# Altium footprint library PcbLib_ICs.PcbLib: 317 footprints (part 15 of 24) (continued)
## QFN88(TICP) [mm] "QFN, 88-Leads, Body 10.00x10.00mm, Pitch 0.40mm, Thermal Pad 5.60x5.60mm, IPC Medium Density" (continued)
  region: -1.3,2 -1.3,1.5 -0.8,1.5 -0.8,2
  region: 2,0.8 2,1.3 1.5,1.3 1.5,0.8
  region: 1.3,0.8 1.3,1.3 0.8,1.3 0.8,0.8
  region: 0.8,2 0.8,1.5 1.3,1.5 1.3,2
  region: 1.5,2 1.5,1.5 2,1.5 2,2
  region: 0.6,-2 0.6,-1.5 0.1,-1.5 0.1,-2
  region: -0.1,-2 -0.1,-1.5 -0.6,-1.5 -0.6,-2
  region: -0.6,-0.8 -0.6,-1.3 -0.1,-1.3 -0.1,-0.8
  region: 0.1,-0.8 0.1,-1.3 0.6,-1.3 0.6,-0.8
  region: -0.8,-2 -0.8,-1.5 -1.3,-1.5 -1.3,-2
  region: -1.5,-2 -1.5,-1.5 -2,-1.5 -2,-2
  region: -2,-0.8 -2,-1.3 -1.5,-1.3 -1.5,-0.8
  region: -1.3,-0.8 -1.3,-1.3 -0.8,-1.3 -0.8,-0.8
  region: 2,-2 2,-1.5 1.5,-1.5 1.5,-2
  region: 1.3,-2 1.3,-1.5 0.8,-1.5 0.8,-2
  region: 0.8,-0.8 0.8,-1.3 1.3,-1.3 1.3,-0.8
  region: 1.5,-0.8 1.5,-1.3 2,-1.3 2,-0.8
  region: 2.7,-0.6 2.7,-0.1 2.2,-0.1 2.2,-0.6
  region: 2.2,0.6 2.2,0.1 2.7,0.1 2.7,0.6
  region: 2.7,0.8 2.7,1.3 2.2,1.3 2.2,0.8
  region: 2.2,2 2.2,1.5 2.7,1.5 2.7,2
  region: 2.7,-2 2.7,-1.5 2.2,-1.5 2.2,-2
  region: 2.2,-0.8 2.2,-1.3 2.7,-1.3 2.7,-0.8
  region: -2.7,0.6 -2.7,0.1 -2.2,0.1 -2.2,0.6
  region: -2.2,-0.6 -2.2,-0.1 -2.7,-0.1 -2.7,-0.6
  region: -2.7,-0.8 -2.7,-1.3 -2.2,-1.3 -2.2,-0.8
  region: -2.2,-2 -2.2,-1.5 -2.7,-1.5 -2.7,-2
  region: -2.7,2 -2.7,1.5 -2.2,1.5 -2.2,2
  region: -2.2,0.8 -2.2,1.3 -2.7,1.3 -2.7,0.8
  region: -0.6,2.7 -0.6,2.2 -0.1,2.2 -0.1,2.7
  region: 0.1,2.7 0.1,2.2 0.6,2.2 0.6,2.7
  region: -2,2.7 -2,2.2 -1.5,2.2 -1.5,2.7
  region: -1.3,2.7 -1.3,2.2 -0.8,2.2 -0.8,2.7
  region: 0.8,2.7 0.8,2.2 1.3,2.2 1.3,2.7
  region: 1.5,2.7 1.5,2.2 2,2.2 2,2.7
  region: 2.2,2.7 2.2,2.2 2.7,2.2 2.7,2.7
  region: -2.7,2.7 -2.7,2.2 -2.2,2.2 -2.2,2.7
  region: 0.6,-2.7 0.6,-2.2 0.1,-2.2 0.1,-2.7
  region: -0.1,-2.7 -0.1,-2.2 -0.6,-2.2 -0.6,-2.7
  region: 2,-2.7 2,-2.2 1.5,-2.2 1.5,-2.7
  region: 1.3,-2.7 1.3,-2.2 0.8,-2.2 0.8,-2.7
  region: -0.8,-2.7 -0.8,-2.2 -1.3,-2.2 -1.3,-2.7
  region: -1.5,-2.7 -1.5,-2.2 -2,-2.2 -2,-2.7
  region: -2.2,-2.7 -2.2,-2.2 -2.7,-2.2 -2.7,-2.7
  region: 2.7,-2.7 2.7,-2.2 2.2,-2.2 2.2,-2.7
Bottom Solder:
  region: -3,3 -0.6,3 0,2.4 0.6,3 3,3 3,0.6 2.4,0 3,-0.601 3,-3 0.6,-3 0,-2.4 -0.6,-3 -3,-3 -3,-0.6 -2.4,0 -3,0.6
Top Assy:
  drawing of 798 lines, arcs and shapes, not listed
  text ".Designator" at -3.443,0.933 h2
Top Text:
  lines w0.05: -5.575,-5.575 5.575,-5.575 5.575,5.575 -5.575,5.575 -5.575,-5.575
  lines w0.1: -0.5,0 0.5,0 ; 0,-0.5 0,0.5
3D body "MDR32F02FI_QFN88_TICP.x_t": height 0.75, standoff 0, extent -5.02,-5.02 5.02,5.02

## QFN-36_USB2514 [mm] "QFN-36 with 0.5mm pitch"
height 1
pads (37):
  rect 0.8x0.28 smd paste+0 mask+0.05: 1(-2.9,2)
  oval 0.8x0.28 smd paste+0 mask+0.05: 2(-2.9,1.5) 3(-2.9,1) 4(-2.9,0.5) 5(-2.9,0) 6(-2.9,-0.5) 7(-2.9,-1) 8(-2.9,-1.5) 9(-2.9,-2) 19(2.9,-2) 20(2.9,-1.5) 21(2.9,-1) 22(2.9,-0.5) 23(2.9,0) 24(2.9,0.5) 25(2.9,1) 26(2.9,1.5) 27(2.9,2)
  oval 0.28x0.8 smd paste+0 mask+0.05: 10(-2,-2.9) 11(-1.5,-2.9) 12(-1,-2.9) 13(-0.5,-2.9) 14(0,-2.9) 15(0.5,-2.9) 16(1,-2.9) 17(1.5,-2.9) 18(2,-2.9) 28(2,2.9) 29(1.5,2.9) 30(1,2.9) 31(0.5,2.9) 32(0,2.9) 33(-0.5,2.9) 34(-1,2.9) 35(-1.5,2.9) 36(-2,2.9)
  rrect7% 3.7x3.7 smd paste-10 mask+0.05: EP(0,0)
via 1.25,0 diameter 0.7 hole 0.3
via 0,0 diameter 0.7 hole 0.3
via 0,1.25 diameter 0.7 hole 0.3
via -1.25,0 diameter 0.7 hole 0.3
via 0,-1.25 diameter 0.7 hole 0.3
Top Overlay:
  circle w0.25: c-3.75,2.95 r0.125
  lines w0.2: -3.2,-2.75 -3.2,-3.2 -2.75,-3.2 ; -3.2,2.75 -3.2,3.2 -2.75,3.2 ; 2.75,-3.2 3.2,-3.2 3.2,-2.75 ; 2.75,3.2 3.2,3.2 3.2,2.75
Top Paste:
  rectangle: 0.1,-0.7 0.7,-0.1
  rectangle: -0.7,-0.7 -0.1,-0.1
  rectangle: -1.5,-0.7 -0.9,-0.1
  rectangle: 0.9,-0.7 1.5,-0.1
  region: -0.1,0.7 -0.7,0.7 -0.7,0.1 -0.1,0.1
  region: 0.7,0.7 0.1,0.7 0.1,0.1 0.7,0.1
  region: 1.5,0.7 0.9,0.7 0.9,0.1 1.5,0.1
  region: -0.9,0.7 -1.5,0.7 -1.5,0.1 -0.9,0.1
  region: -0.1,1.5 -0.7,1.5 -0.7,0.9 -0.1,0.9
  region: 0.7,1.5 0.1,1.5 0.1,0.9 0.7,0.9
  region: 1.5,1.5 0.9,1.5 0.9,0.9 1.5,0.9
  region: -0.9,1.5 -1.5,1.5 -1.5,0.9 -0.9,0.9
  rectangle: 0.1,-1.5 0.7,-0.9
  rectangle: -0.7,-1.5 -0.1,-0.9
  rectangle: -1.5,-1.5 -0.9,-0.9
  rectangle: 0.9,-1.5 1.5,-0.9
Bottom Solder:
  region: -1.95,1.95 -0.25,1.95 0,1.7 0.25,1.95 1.95,1.95 1.95,0.25 1.7,0 1.95,-0.25 1.95,-1.95 0.25,-1.95 0,-1.7 -0.25,-1.95 -1.95,-1.95 -1.95,-0.25 -1.7,0 -1.95,0.25
Top Assy:
  drawing of 297 lines, arcs and shapes, not listed
  text ".Designator" at -3.443,-0.467 h2
Top Text:
  lines w0.05: -3.6,-3.6 3.6,-3.6 3.6,3.6 -3.6,3.6 -3.6,-3.6
  lines w0.1: -0.5,0 0.5,0 ; 0,-0.5 0,0.5
3D body "QFN-36_USB2514B.x_t": height 0.9, standoff 0, extent -3.02,-3.02 3.02,3.02

## QFN-44 [mm] "QFN, 44-Leads, Body 7,00x7,00mm, Pitch 0,50mm, Thermal Pad 5,15x5,10mm, IPC Medium Density"
height 0.75
pads (45):
  rect 0.95x0.25 smd paste+0 mask+0.075: 1(-3.375,2.5)
  oval 0.95x0.25 smd paste+0 mask+0.075: 2(-3.375,2) 3(-3.375,1.5) 4(-3.375,1) 5(-3.375,0.5) 6(-3.375,0) 7(-3.375,-0.5) 8(-3.375,-1) 9(-3.375,-1.5) 10(-3.375,-2) 11(-3.375,-2.5) 23(3.375,-2.5) 24(3.375,-2) 25(3.375,-1.5) 26(3.375,-1) 27(3.375,-0.5) 28(3.375,0) 29(3.375,0.5) 30(3.375,1) 31(3.375,1.5) 32(3.375,2) 33(3.375,2.5)
  oval 0.25x0.95 smd paste+0 mask+0.075: 12(-2.5,-3.375) 13(-2,-3.375) 14(-1.5,-3.375) 15(-1,-3.375) 16(-0.5,-3.375) 17(0,-3.375) 18(0.5,-3.375) 19(1,-3.375) 20(1.5,-3.375) 21(2,-3.375) 22(2.5,-3.375) 34(2.5,3.375) 35(2,3.375) 36(1.5,3.375) 37(1,3.375) 38(0.5,3.375) 39(0,3.375) 40(-0.5,3.375) 41(-1,3.375) 42(-1.5,3.375) 43(-2,3.375) 44(-2.5,3.375)
  rrect15% 5.15x5.15 smd paste-50 mask+0.075: EP(0,0)
via 2.2,-2.2 diameter 0.5 hole 0.2
via 1.1,-2.2 diameter 0.5 hole 0.2
via 0,-2.2 diameter 0.5 hole 0.2
via -1.1,-2.2 diameter 0.5 hole 0.2
via -2.2,-2.2 diameter 0.5 hole 0.2
via 2.2,-1.1 diameter 0.5 hole 0.2
via 1.1,-1.1 diameter 0.5 hole 0.2
via 0,-1.1 diameter 0.5 hole 0.2
via -1.1,-1.1 diameter 0.5 hole 0.2
via -2.2,-1.1 diameter 0.5 hole 0.2
via 2.2,0 diameter 0.5 hole 0.2
via 1.1,0 diameter 0.5 hole 0.2
via 0,0 diameter 0.5 hole 0.2
via -1.1,0 diameter 0.5 hole 0.2
via -2.2,0 diameter 0.5 hole 0.2
via 2.2,1.1 diameter 0.5 hole 0.2
via 1.1,1.1 diameter 0.5 hole 0.2
via 0,1.1 diameter 0.5 hole 0.2
via -1.1,1.1 diameter 0.5 hole 0.2
via -2.2,1.1 diameter 0.5 hole 0.2
via 2.2,2.2 diameter 0.5 hole 0.2
via 1.1,2.2 diameter 0.5 hole 0.2
via 0,2.2 diameter 0.5 hole 0.2
via -1.1,2.2 diameter 0.5 hole 0.2
via -2.2,2.2 diameter 0.5 hole 0.2
Top Overlay:
  circle w0.25: c-4.35,3.55 r0.125
  lines w0.2: -3.7,-3.025 -3.7,-3.7 -3.025,-3.7 ; -3.7,3.025 -3.7,3.7 -3.025,3.7 ; 3.025,-3.7 3.7,-3.7 3.7,-3.025 ; 3.025,3.7 3.7,3.7 3.7,3.025
Top Paste:
  region: 0.1,0.6 0.1,0.1 0.6,0.1 0.6,0.6
  region: -0.6,0.6 -0.6,0.1 -0.1,0.1 -0.1,0.6
  region: -1.3,0.6 -1.3,0.1 -0.8,0.1 -0.8,0.6
  region: -2,0.6 -2,0.1 -1.5,0.1 -1.5,0.6
  region: -2.65,0.6 -2.65,0.1 -2.2,0.1 -2.2,0.6
  region: 0.8,0.6 0.8,0.1 1.3,0.1 1.3,0.6
  region: 1.5,0.6 1.5,0.1 2,0.1 2,0.6
  region: 2.2,0.6 2.2,0.1 2.65,0.1 2.65,0.6
  region: 0.1,1.3 0.1,0.8 0.6,0.8 0.6,1.3
  region: -0.6,1.3 -0.6,0.8 -0.1,0.8 -0.1,1.3
  region: -1.3,1.3 -1.3,0.8 -0.8,0.8 -0.8,1.3
  region: -2,1.3 -2,0.8 -1.5,0.8 -1.5,1.3
  region: -2.65,1.3 -2.65,0.8 -2.2,0.8 -2.2,1.3
  region: 0.8,1.3 0.8,0.8 1.3,0.8 1.3,1.3
  region: 1.5,1.3 1.5,0.8 2,0.8 2,1.3
  region: 2.2,1.3 2.2,0.8 2.65,0.8 2.65,1.3
  region: 0.1,2 0.1,1.5 0.6,1.5 0.6,2
  region: -0.6,2 -0.6,1.5 -0.1,1.5 -0.1,2
  region: -1.3,2 -1.3,1.5 -0.8,1.5 -0.8,2
  region: -2,2 -2,1.5 -1.5,1.5 -1.5,2
  region: -2.65,2 -2.65,1.5 -2.2,1.5 -2.2,2
  region: 0.8,2 0.8,1.5 1.3,1.5 1.3,2
  region: 1.5,2 1.5,1.5 2,1.5 2,2
  region: 2.2,2 2.2,1.5 2.65,1.5 2.65,2
  region: -0.1,-0.6 -0.1,-0.1 -0.6,-0.1 -0.6,-0.6
  region: 0.6,-0.6 0.6,-0.1 0.1,-0.1 0.1,-0.6
  region: 1.3,-0.6 1.3,-0.1 0.8,-0.1 0.8,-0.6
  region: 2,-0.6 2,-0.1 1.5,-0.1 1.5,-0.6
  region: 2.65,-0.6 2.65,-0.1 2.2,-0.1 2.2,-0.6
  region: -0.8,-0.6 -0.8,-0.1 -1.3,-0.1 -1.3,-0.6
  region: -1.5,-0.6 -1.5,-0.1 -2,-0.1 -2,-0.6
  region: -2.2,-0.6 -2.2,-0.1 -2.65,-0.1 -2.65,-0.6
  region: -0.1,-1.3 -0.1,-0.8 -0.6,-0.8 -0.6,-1.3
  region: 0.6,-1.3 0.6,-0.8 0.1,-0.8 0.1,-1.3
  region: 1.3,-1.3 1.3,-0.8 0.8,-0.8 0.8,-1.3
  region: 2,-1.3 2,-0.8 1.5,-0.8 1.5,-1.3
  region: 2.65,-1.3 2.65,-0.8 2.2,-0.8 2.2,-1.3
  region: -0.8,-1.3 -0.8,-0.8 -1.3,-0.8 -1.3,-1.3
  region: -1.5,-1.3 -1.5,-0.8 -2,-0.8 -2,-1.3
  region: -2.2,-1.3 -2.2,-0.8 -2.65,-0.8 -2.65,-1.3
  region: -0.1,-2 -0.1,-1.5 -0.6,-1.5 -0.6,-2
  region: 0.6,-2 0.6,-1.5 0.1,-1.5 0.1,-2
  region: 1.3,-2 1.3,-1.5 0.8,-1.5 0.8,-2
  region: 2,-2 2,-1.5 1.5,-1.5 1.5,-2
  region: 2.65,-2 2.65,-1.5 2.2,-1.5 2.2,-2
  region: -0.8,-2 -0.8,-1.5 -1.3,-1.5 -1.3,-2
  region: -1.5,-2 -1.5,-1.5 -2,-1.5 -2,-2
  region: -2.2,-2 -2.2,-1.5 -2.65,-1.5 -2.65,-2
  region: -1.5,-2.2 -2,-2.2 -2,-2.65 -1.5,-2.65
  rectangle: -0.6,-2.65 -0.1,-2.2
  rectangle: -1.3,-2.65 -0.8,-2.2
  region: 0.6,-2.2 0.1,-2.2 0.1,-2.65 0.6,-2.65
  region: 1.3,-2.2 0.8,-2.2 0.8,-2.65 1.3,-2.65
  region: 2,-2.2 1.5,-2.2 1.5,-2.65 2,-2.65
  region: 1.3,2.65 0.8,2.65 0.8,2.2 1.3,2.2
  region: 2,2.65 1.5,2.65 1.5,2.2 2,2.2
  rectangle: 0.1,2.2 0.6,2.65
  rectangle: -0.6,2.2 -0.1,2.65
  rectangle: -1.3,2.2 -0.8,2.65
  region: -1.5,2.65 -2,2.65 -2,2.2 -1.5,2.2
Top Assy:
  circle w0.05: c-2.75,2.75 r0.3
  lines w0.05: -3.557,-2.6 -3.59,-2.6 -3.59,-2.4 -3.557,-2.4 ; -3.557,-2.1 -3.59,-2.1 -3.59,-1.9 -3.557,-1.9 ; -3.557,-1.6 -3.59,-1.6 -3.59,-1.4 -3.557,-1.4 ; -3.557,-1.1 -3.59,-1.1 -3.59,-0.9 -3.557,-0.9 ; -3.557,-0.6 -3.59,-0.6 -3.59,-0.4 -3.557,-0.4 ; -3.557,-0.1 -3.59,-0.1 -3.59,0.1 -3.557,0.1 ; -3.557,0.4 -3.59,0.4 -3.59,0.6 -3.557,0.6 ; -3.557,0.9 -3.59,0.9 -3.59,1.1 -3.557,1.1 ; -3.557,1.4 -3.59,1.4 -3.59,1.6 -3.557,1.6 ; -3.557,1.9 -3.59,1.9 -3.59,2.1 -3.557,2.1 ; -3.557,2.4 -3.59,2.4 -3.59,2.6 -3.557,2.6 ; -2.6,-3.557 -2.6,-3.59 -2.4,-3.59 -2.4,-3.557 ; -2.6,3.557 -2.6,3.59 -2.4,3.59 -2.4,3.557 ; -2.1,-3.557 -2.1,-3.59 -1.9,-3.59 -1.9,-3.557 ; -2.1,3.557 -2.1,3.59 -1.9,3.59 -1.9,3.557 ; -1.6,-3.557 -1.6,-3.59 -1.4,-3.59 -1.4,-3.557 ; -1.6,3.557 -1.6,3.59 -1.4,3.59 -1.4,3.557 ; -1.1,-3.557 -1.1,-3.59 -0.9,-3.59 -0.9,-3.557 ; -1.1,3.557 -1.1,3.59 -0.9,3.59 -0.9,3.557 ; -0.6,-3.557 -0.6,-3.59 -0.4,-3.59 -0.4,-3.557 ; -0.6,3.557 -0.6,3.59 -0.4,3.59 -0.4,3.557 ; -0.1,-3.557 -0.1,-3.59 0.1,-3.59 0.1,-3.557 ; -0.1,3.557 -0.1,3.59 0.1,3.59 0.1,3.557 ; 0.4,-3.557 0.4,-3.59 0.6,-3.59 0.6,-3.557 ; 0.4,3.557 0.4,3.59 0.6,3.59 0.6,3.557 ; 0.9,-3.557 0.9,-3.59 1.1,-3.59 1.1,-3.557 ; 0.9,3.557 0.9,3.59 1.1,3.59 1.1,3.557 ; 1.4,-3.557 1.4,-3.59 1.6,-3.59 1.6,-3.557 ; 1.4,3.557 1.4,3.59 1.6,3.59 1.6,3.557 ; 1.9,-3.557 1.9,-3.59 2.1,-3.59 2.1,-3.557 ; 1.9,3.557 1.9,3.59 2.1,3.59 2.1,3.557 ; 2.4,-3.557 2.4,-3.59 2.6,-3.59 2.6,-3.557 ; 2.4,3.557 2.4,3.59 2.6,3.59 2.6,3.557 ; 3.557,-2.6 3.59,-2.6 3.59,-2.4 3.557,-2.4 ; 3.557,-2.1 3.59,-2.1 3.59,-1.9 3.557,-1.9 ; 3.557,-1.6 3.59,-1.6 3.59,-1.4 3.557,-1.4 ; 3.557,-1.1 3.59,-1.1 3.59,-0.9 3.557,-0.9 ; 3.557,-0.6 3.59,-0.6 3.59,-0.4 3.557,-0.4 ; 3.557,-0.1 3.59,-0.1 3.59,0.1 3.557,0.1 ; 3.557,0.4 3.59,0.4 3.59,0.6 3.557,0.6 ; 3.557,0.9 3.59,0.9 3.59,1.1 3.557,1.1 ; 3.557,1.4 3.59,1.4 3.59,1.6 3.557,1.6 ; 3.557,1.9 3.59,1.9 3.59,2.1 3.557,2.1 ; 3.557,2.4 3.59,2.4 3.59,2.6 3.557,2.6 ; -3.55,-3.55 3.55,-3.55 3.55,3.55 -3.55,3.55 -3.55,-3.55
  text ".Designator" at -3.443,-0.467 h2
Top Text:
  lines w0.05: -4.1,-4.1 4.1,-4.1 4.1,4.1 -4.1,4.1 -4.1,-4.1
  lines w0.1: -0.5,0 0.5,0 ; 0,-0.5 0,0.5
3D body "QFN-44.step": height 0.75, standoff 0, extent -3.6,-3.6 3.6,3.6

## QFN-64_USB2517 [mm] "QFN-64 with 0.5mm pitch"
height 1
pads (65):
  rect 0.75x0.28 smd paste+0 mask+0.05: 1(-4.425,3.75)
  oval 0.75x0.28 smd paste+0 mask+0.05: 2(-4.425,3.25) 3(-4.425,2.75) 4(-4.425,2.25) 5(-4.425,1.75) 6(-4.425,1.25) 7(-4.425,0.75) 8(-4.425,0.25) 9(-4.425,-0.25) 10(-4.425,-0.75) 11(-4.425,-1.25) 12(-4.425,-1.75) 13(-4.425,-2.25) 14(-4.425,-2.75) 15(-4.425,-3.25) 16(-4.425,-3.75) 33(4.425,-3.75) 34(4.425,-3.25) 35(4.425,-2.75) 36(4.425,-2.25) 37(4.425,-1.75) 38(4.425,-1.25) 39(4.425,-0.75) 40(4.425,-0.25) 41(4.425,0.25) 42(4.425,0.75) 43(4.425,1.25) 44(4.425,1.75) 45(4.425,2.25) 46(4.425,2.75) 47(4.425,3.25) 48(4.425,3.75)
  oval 0.28x0.75 smd paste+0 mask+0.05: 17(-3.775,-4.425) 18(-3.275,-4.425) 19(-2.775,-4.425) 20(-2.275,-4.425) 21(-1.775,-4.425) 22(-1.275,-4.425) 23(-0.775,-4.425) 24(-0.275,-4.425) 25(0.225,-4.425) 26(0.725,-4.425) 27(1.225,-4.425) 28(1.725,-4.425) 29(2.225,-4.425) 30(2.725,-4.425) 31(3.225,-4.425) 32(3.725,-4.425) 49(3.75,4.425) 50(3.25,4.425) 51(2.75,4.425) 52(2.25,4.425) 53(1.75,4.425) 54(1.25,4.425) 55(0.75,4.425) 56(0.25,4.425) 57(-0.25,4.425) 58(-0.75,4.425) 59(-1.25,4.425) 60(-1.75,4.425) 61(-2.25,4.425) 62(-2.75,4.425) 63(-3.25,4.425) 64(-3.75,4.425)
  rrect10% 5x5 smd paste-10 mask+0.08: EP(0,0)
via 0,0 diameter 0.7 hole 0.3
via 2,2 diameter 0.7 hole 0.3
via 1.75,1 diameter 0.7 hole 0.3
via 1,1.75 diameter 0.7 hole 0.3
via 0.75,0.75 diameter 0.7 hole 0.3
via -0.75,0.75 diameter 0.7 hole 0.3
via -1.75,1 diameter 0.7 hole 0.3
via -1,1.75 diameter 0.7 hole 0.3
via -2,2 diameter 0.7 hole 0.3
via -0.75,-0.75 diameter 0.7 hole 0.3
via -1,-1.75 diameter 0.7 hole 0.3
via -1.75,-1 diameter 0.7 hole 0.3
via -2,-2 diameter 0.7 hole 0.3
via 0.75,-0.75 diameter 0.7 hole 0.3
via 1.75,-1 diameter 0.7 hole 0.3
via 1,-1.75 diameter 0.7 hole 0.3
via 2,-2 diameter 0.7 hole 0.3
via -1.4,0 diameter 0.7 hole 0.3
via 0,1.4 diameter 0.7 hole 0.3
via 1.4,0 diameter 0.7 hole 0.3
via 0,-1.4 diameter 0.7 hole 0.3
Top Overlay:
  circle w0.25: c-5.35,4.55 r0.125
  lines w0.2: -4.65,-4.2 -4.65,-4.65 -4.2,-4.65 ; -4.65,4.2 -4.65,4.65 -4.2,4.65 ; 4.2,-4.65 4.65,-4.65 4.65,-4.2 ; 4.2,4.65 4.65,4.65 4.65,4.2
Top Paste:
  region: -1.7,2.3 -2.3,2.3 -2.3,1.7 -1.7,1.7
  region: -1.7,1.5 -2.3,1.5 -2.3,0.9 -1.7,0.9
  rectangle: -2.3,-2.3 -1.7,-1.7
  rectangle: -2.3,-1.5 -1.7,-0.9
  rectangle: -2.3,-0.7 -1.7,-0.1
  region: -1.7,0.7 -2.3,0.7 -2.3,0.1 -1.7,0.1
  rectangle: 1.7,-2.3 2.3,-1.7
  rectangle: 1.7,-1.5 2.3,-0.9
  region: 2.3,2.3 1.7,2.3 1.7,1.7 2.3,1.7
  region: 2.3,1.5 1.7,1.5 1.7,0.9 2.3,0.9
  region: 2.3,0.7 1.7,0.7 1.7,0.1 2.3,0.1
  rectangle: 1.7,-0.7 2.3,-0.1
  rectangle: 0.9,-2.3 1.5,-1.7
  rectangle: -1.5,-2.3 -0.9,-1.7
  rectangle: -0.7,-2.3 -0.1,-1.7
  rectangle: 0.1,-2.3 0.7,-1.7
  rectangle: 0.9,-1.5 1.5,-0.9
  rectangle: -1.5,-1.5 -0.9,-0.9
  rectangle: -0.7,-1.5 -0.1,-0.9
  rectangle: 0.1,-1.5 0.7,-0.9
  region: -0.9,2.3 -1.5,2.3 -1.5,1.7 -0.9,1.7
  region: 1.5,2.3 0.9,2.3 0.9,1.7 1.5,1.7
  region: 0.7,2.3 0.1,2.3 0.1,1.7 0.7,1.7
  region: -0.1,2.3 -0.7,2.3 -0.7,1.7 -0.1,1.7
  region: -0.9,1.5 -1.5,1.5 -1.5,0.9 -0.9,0.9
  region: 1.5,1.5 0.9,1.5 0.9,0.9 1.5,0.9
  region: 0.7,1.5 0.1,1.5 0.1,0.9 0.7,0.9
  region: -0.1,1.5 -0.7,1.5 -0.7,0.9 -0.1,0.9
  region: -0.9,0.7 -1.5,0.7 -1.5,0.1 -0.9,0.1
  region: 1.5,0.7 0.9,0.7 0.9,0.1 1.5,0.1
  region: 0.7,0.7 0.1,0.7 0.1,0.1 0.7,0.1
  region: -0.1,0.7 -0.7,0.7 -0.7,0.1 -0.1,0.1
  rectangle: 0.9,-0.7 1.5,-0.1
  rectangle: -1.5,-0.7 -0.9,-0.1
  rectangle: -0.7,-0.7 -0.1,-0.1
  rectangle: 0.1,-0.7 0.7,-0.1
Bottom Solder:
  region: -3,3 -0.75,3 0,2.25 0.75,3 3,3 3,0.75 2.25,0 3,-0.75 3,-3 0.75,-3 0,-2.25 -0.75,-3 -3,-3 -3,-0.75 -2.25,0 -3,0.75
Top Assy:
  drawing of 801 lines, arcs and shapes, not listed
  text ".Designator" at -3.443,-0.467 h2
Top Text:
  lines w0.05: -4.85,-4.85 -4.85,4.85 4.85,4.85 4.85,-4.85 -4.85,-4.85
  lines w0.1: -0.5,0 0.5,0 ; 0,-0.5 0,0.5
3D body "User Library-LFCSP-64 AD9984AKCPZ-170.step": height 0.85, standoff -0.02, extent -4.5,-4.5 4.5,4.5

## QFN-72_USB5537B [mm] "QFN-72 package with 0.5mm pitch"
height 1
pads (81):
  rect 0.8x0.25 smd paste+0 mask+0.05: 1(-4.925,4.25)
  oval 0.8x0.25 smd paste+0 mask+0.05: 2(-4.925,3.75) 3(-4.925,3.25) 4(-4.925,2.75) 5(-4.925,2.25) 6(-4.925,1.75) 7(-4.925,1.25) 8(-4.925,0.75) 9(-4.925,0.25) 10(-4.925,-0.25) 11(-4.925,-0.75) 12(-4.925,-1.25) 13(-4.925,-1.75) 14(-4.925,-2.25) 15(-4.925,-2.75) 16(-4.925,-3.25) 17(-4.925,-3.75) 18(-4.925,-4.25) 37(4.925,-4.25) 38(4.925,-3.75) 39(4.925,-3.25) 40(4.925,-2.75) 41(4.925,-2.25) 42(4.925,-1.75) 43(4.925,-1.25) 44(4.925,-0.75) 45(4.925,-0.25) 46(4.925,0.25) 47(4.925,0.75) 48(4.925,1.25) 49(4.925,1.75) 50(4.925,2.25) 51(4.925,2.75) 52(4.925,3.25) 53(4.925,3.75) 54(4.925,4.25)
  oval 0.25x0.8 smd paste+0 mask+0.05: 19(-4.25,-4.925) 20(-3.75,-4.925) 21(-3.25,-4.925) 22(-2.75,-4.925) 23(-2.25,-4.925) 24(-1.75,-4.925) 25(-1.25,-4.925) 26(-0.75,-4.925) 27(-0.25,-4.925) 28(0.25,-4.925) 29(0.75,-4.925) 30(1.25,-4.925) 31(1.75,-4.925) 32(2.25,-4.925) 33(2.75,-4.925) 34(3.25,-4.925) 35(3.75,-4.925) 36(4.25,-4.925) 55(4.25,4.925) 56(3.75,4.925) 57(3.25,4.925) 58(2.75,4.925) 59(2.25,4.925) 60(1.75,4.925) 61(1.25,4.925) 62(0.75,4.925) 63(0.25,4.925) 64(-0.25,4.925) 65(-0.75,4.925) 66(-1.25,4.925) 67(-1.75,4.925) 68(-2.25,4.925) 69(-2.75,4.925) 70(-3.25,4.925) 71(-3.75,4.925) 72(-4.25,4.925)
  rrect10% 2x2 smd paste-10 mask+0.08: EP(-2.2,-2.2) EP(-2.2,0) EP(-2.2,2.2) EP(0,-2.2) EP(0,0) EP(0,2.2) EP(2.2,-2.2) EP(2.2,0) EP(2.2,2.2)
via -2.8,1.6 diameter 0.7 hole 0.3
via -1.6,1.6 diameter 0.7 hole 0.3
via -1.6,2.8 diameter 0.7 hole 0.3
via -2.8,2.8 diameter 0.7 hole 0.3
via -0.6,1.6 diameter 0.7 hole 0.3
via 0.6,1.6 diameter 0.7 hole 0.3
via 0.6,2.8 diameter 0.7 hole 0.3
via -0.6,2.8 diameter 0.7 hole 0.3
via 1.6,1.6 diameter 0.7 hole 0.3
via 2.8,1.6 diameter 0.7 hole 0.3
via 2.8,2.8 diameter 0.7 hole 0.3
via 1.6,2.8 diameter 0.7 hole 0.3
via 1.6,-2.8 diameter 0.7 hole 0.3
via 2.8,-2.8 diameter 0.7 hole 0.3
via 2.8,-1.6 diameter 0.7 hole 0.3
via 1.6,-1.6 diameter 0.7 hole 0.3
via 1.6,-0.6 diameter 0.7 hole 0.3
via 2.8,-0.6 diameter 0.7 hole 0.3
via 2.8,0.6 diameter 0.7 hole 0.3
via 1.6,0.6 diameter 0.7 hole 0.3
via -2.8,-0.6 diameter 0.7 hole 0.3
via -1.6,-0.6 diameter 0.7 hole 0.3
via -1.6,0.6 diameter 0.7 hole 0.3
via -2.8,0.6 diameter 0.7 hole 0.3
via -0.6,-0.6 diameter 0.7 hole 0.3
via 0.6,-0.6 diameter 0.7 hole 0.3
via 0.6,0.6 diameter 0.7 hole 0.3
via -0.6,0.6 diameter 0.7 hole 0.3
via -0.6,-2.8 diameter 0.7 hole 0.3
via 0.6,-2.8 diameter 0.7 hole 0.3
via 0.6,-1.6 diameter 0.7 hole 0.3
via -0.6,-1.6 diameter 0.7 hole 0.3
via -2.8,-2.8 diameter 0.7 hole 0.3
via -1.6,-2.8 diameter 0.7 hole 0.3
via -1.6,-1.6 diameter 0.7 hole 0.3
via -2.8,-1.6 diameter 0.7 hole 0.3
Top Overlay:
  circle w0.25: c-5.825,5.025 r0.125
  lines w0.2: -5.175,-4.775 -4.775,-5.175 ; -5.175,4.775 -4.775,5.175 ; 4.775,-5.175 5.175,-4.775 ; 4.775,5.175 5.175,4.775
Top Paste:
  region: 2.3,-2.3 2.3,-3 3,-3 3,-2.3
  region: 2.3,-1.4 2.3,-2.1 3,-2.1 3,-1.4
  region: 2.1,-1.4 1.4,-1.4 1.4,-2.1 2.1,-2.1
  region: 2.1,-2.3 1.4,-2.3 1.4,-3 2.1,-3
  region: 0.1,-2.3 0.1,-3 0.8,-3 0.8,-2.3
  region: 0.1,-1.4 0.1,-2.1 0.8,-2.1 0.8,-1.4
  region: -0.1,-1.4 -0.8,-1.4 -0.8,-2.1 -0.1,-2.1
  region: -0.1,-2.3 -0.8,-2.3 -0.8,-3 -0.1,-3
  region: -2.1,-2.3 -2.1,-3 -1.4,-3 -1.4,-2.3
  region: -2.1,-1.4 -2.1,-2.1 -1.4,-2.1 -1.4,-1.4
  region: -2.3,-1.4 -3,-1.4 -3,-2.1 -2.3,-2.1
  region: -2.3,-2.3 -3,-2.3 -3,-3 -2.3,-3
  region: -2.1,-0.1 -2.1,-0.8 -1.4,-0.8 -1.4,-0.1
  region: -2.1,0.8 -2.1,0.1 -1.4,0.1 -1.4,0.8
  region: -2.3,0.8 -3,0.8 -3,0.1 -2.3,0.1
  region: -2.3,-0.1 -3,-0.1 -3,-0.8 -2.3,-0.8
  region: 0.1,-0.1 0.1,-0.8 0.8,-0.8 0.8,-0.1
  region: 0.1,0.8 0.1,0.1 0.8,0.1 0.8,0.8
  region: -0.1,0.8 -0.8,0.8 -0.8,0.1 -0.1,0.1
  region: -0.1,-0.1 -0.8,-0.1 -0.8,-0.8 -0.1,-0.8
  region: 2.3,-0.1 2.3,-0.8 3,-0.8 3,-0.1
  region: 2.3,0.8 2.3,0.1 3,0.1 3,0.8
  region: 2.1,0.8 1.4,0.8 1.4,0.1 2.1,0.1
  region: 2.1,-0.1 1.4,-0.1 1.4,-0.8 2.1,-0.8
  region: 2.3,2.1 2.3,1.4 3,1.4 3,2.1
  region: 2.3,3 2.3,2.3 3,2.3 3,3
  region: 2.1,3 1.4,3 1.4,2.3 2.1,2.3
  region: 2.1,2.1 1.4,2.1 1.4,1.4 2.1,1.4
  region: 0.1,2.1 0.1,1.4 0.8,1.4 0.8,2.1
  region: 0.1,3 0.1,2.3 0.8,2.3 0.8,3
  region: -0.1,3 -0.8,3 -0.8,2.3 -0.1,2.3
  region: -0.1,2.1 -0.8,2.1 -0.8,1.4 -0.1,1.4
  region: -2.1,2.1 -2.1,1.4 -1.4,1.4 -1.4,2.1
  region: -2.1,3 -2.1,2.3 -1.4,2.3 -1.4,3
  region: -2.3,3 -3,3 -3,2.3 -2.3,2.3
  region: -2.3,2.1 -3,2.1 -3,1.4 -2.3,1.4
Top Solder:
  rectangle: -3.3,-3.3 3.3,3.3
Bottom Solder:
  region: -3.25,3.25 -0.35,3.25 0,2.9 0.35,3.25 3.25,3.25 3.25,0.35 2.9,0 3.25,-0.351 3.25,-3.25 0.35,-3.25 0,-2.9 -0.35,-3.25 -3.25,-3.25 -3.25,-0.35 -2.9,0 -3.25,0.351
Top Assy:
  drawing of 249 lines, arcs and shapes, not listed
  text ".Designator" at -3.443,-0.467 h2
Top Text:
  lines w0.05: -5.325,-5.325 5.325,-5.325 5.325,5.325 -5.325,5.325 -5.325,-5.325
  lines w0.1: -0.5,0 0.5,0 ; 0,-0.5 0,0.5
3D body "User Library-LFCSP-72.STEP": height 1, standoff 0, extent -5.02,-5.02 5.02,5.02

## QFN_IR38060 [mm]
height 1
pads (37):
  rect 0.54x0.27 smd paste+0 mask+0: 1(-2.465,1.223) 1(-2.465,1.723) 1(-2.465,2.223) 23(2.465,1.222) 23(2.465,1.721) 23(2.465,2.221)
  rect 0.27x0.54 smd paste+0 mask+0: 1(-1.998,2.962) 1(-1.499,2.962) 23(1.499,2.962) 23(1.998,2.962) 24(-0.626,2.962) 24(-0.127,2.962) 24(0.373,2.962) 24(0.872,2.962)
  rect 0.65x0.27 smd paste+0 mask+0.025: 2(-2.424,0.623) 3(-2.424,0.123) 4(-2.424,-0.726) 5(-2.424,-1.226) 6(-2.424,-1.725) 7(-2.424,-2.224) 17(2.422,-2.224) 18(2.422,-1.725) 19(2.422,-1.226) 20(2.422,-0.726) 21(2.422,0.123)
  rect 0.27x0.65 smd paste+0 mask+0.025: 8(-1.998,-2.924) 9(-1.498,-2.924) 10(-0.998,-2.924) 11(-0.498,-2.924) 12(0.002,-2.924) 14(1.124,-2.924) 15(1.624,-2.924) 16(2.123,-2.924)
  rect 0.395x0.65 smd paste+0 mask+0.025: 13(0.564,-2.924)
  rect 1.091x0.27 smd paste+0 mask+0.025: 22(2.202,0.622)
  rect 3.566x1.968 smd paste-3 mask+0.025: 25(0,-1.301)
  rect 0.599x0.22 smd paste+0 mask+0.025: 26(-1.479,0.412)
Top Layer:
  rectangle: -0.898,0.253 1.058,3.299
  rectangle: -2.8,0.89 -1.13,3.3
  rectangle: 1.315,1.037 2.8,3.297
Top Overlay:
  circle w0.25: c-3.2,2.3 r0.125
  lines w0.2: -2.765,-2.82 -2.765,-3.245 -2.515,-3.245 ; 2.515,-3.244 2.765,-3.244 2.765,-2.819
Top Paste:
  region: 0.7,2.4 0.2,2.4 0.2,1.9 0.7,1.9
  region: 0.7,1.7 0.2,1.7 0.2,1.2 0.7,1.2
  region: 0.7,1 0.2,1 0.2,0.5 0.7,0.5
  region: 0,2.4 -0.5,2.4 -0.5,1.9 0,1.9
  region: 0,1.7 -0.5,1.7 -0.5,1.2 0,1.2
  region: 0,1 -0.5,1 -0.5,0.5 0,0.5
  region: 2,2.49 1.5,2.49 1.5,1.99 2,1.99
  region: 1.5,1.79 1.5,1.29 2,1.29 2,1.79
  rectangle: -1.9,1.79 -1.4,2.29
  region: -1.9,1.59 -1.9,1.09 -1.4,1.09 -1.4,1.59
  rectangle: -0.95,-0.85 -0.45,-0.35
  region: -1.15,-0.35 -1.65,-0.35 -1.65,-0.85 -1.15,-0.85
  region: -1.65,-1.05 -1.65,-1.55 -1.15,-1.55 -1.15,-1.05
  rectangle: -0.95,-1.55 -0.45,-1.05
  rectangle: -0.95,-2.25 -0.45,-1.75
  region: -1.15,-1.75 -1.65,-1.75 -1.65,-2.25 -1.15,-2.25
  rectangle: -0.25,-0.85 0.25,-0.35
  rectangle: -0.25,-1.55 0.25,-1.05
  rectangle: -0.25,-2.25 0.25,-1.75
  rectangle: 0.45,-0.85 0.95,-0.35
  rectangle: 0.45,-1.55 0.95,-1.05
  rectangle: 0.45,-2.25 0.95,-1.75
  rectangle: 1.15,-0.85 1.65,-0.35
  rectangle: 1.15,-1.55 1.65,-1.05
  rectangle: 1.15,-2.25 1.65,-1.75
Top Solder:
  drawing of 158 lines, arcs and shapes, not listed
Top Assy:
  drawing of 221 lines, arcs and shapes, not listed
  text ".Designator" at -3.443,-1.967 h2
Top Text:
  lines w0.1: -0.5,0 0.5,0 ; 0,-0.5 0,0.5
3D body "IR38060.STEP": height 1.02, standoff 0, extent -2.52,-3.02 2.52,3.02